# Altium footprint library MOTHER_BOARD_LS1021_v1.01.PcbLib: 69 footprints (part 5 of 5)
Each footprint in its own frame and in the unit in brackets; x right, y up, seen from the top. Pads: shape width x height; smd on the part's side, far side on the other; paste and mask are expansions set on the pad; w line width, h text height; cw(c..) or ccw(c..) is an arc to the next point about the centre after c.
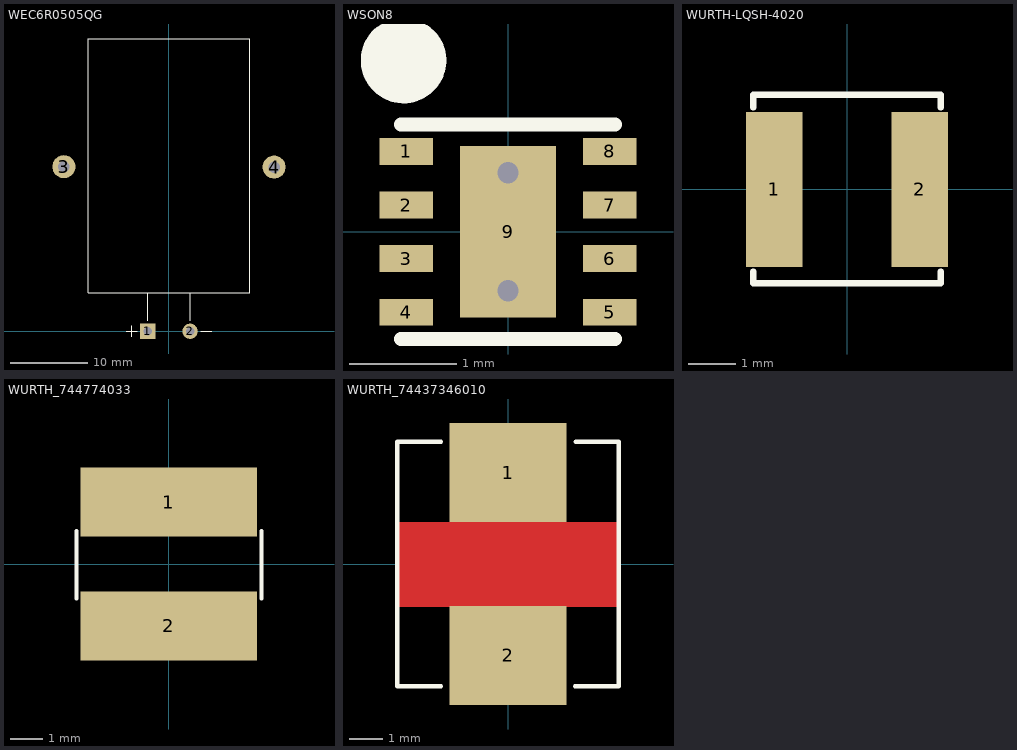
[diagram p4: the footprints below, top view; thin cyan lines are the x and y axes]

## WEC6R0505QG [mm]
pads (4):
  rect 2x2 hole 1.1 paste-0.1 mask+0.05: 1(-2.75,0)
  round 2 hole 1.1 paste-0.1 mask+0.05: 2(2.75,0)
  round 3 hole 1.5 paste-0.1 mask+0.05: 3(-13.65,21.4) 4(13.675,21.35)
Top Overlay:
  lines w0.13: -5.55,0 -4.1,0 ; -4.825,-0.725 -4.825,0.725 ; -2.75,1.4 -2.75,5 ; 2.75,1.4 2.75,5 ; 4.125,0 5.575,0 ; -10.487,5 -10.487,38 10.487,38 10.487,5 -10.487,5
3D body: height 11, standoff 0, extent -10.487,5 10.487,38

## WSON8 [mm]
pads (9):
  rect 0.5x0.25 smd mask+0.05: 1(-0.95,0.75) 2(-0.95,0.25) 3(-0.95,-0.25) 4(-0.95,-0.75) 5(0.95,-0.75) 6(0.95,-0.25) 7(0.95,0.25) 8(0.95,0.75)
  rect 0.9x1.6 smd paste-10 mask+0.05: 9(0,0)
via 0,0.55 diameter 0.45 hole 0.2
via 0,-0.55 diameter 0.45 hole 0.2
Top Overlay:
  circle w0.4: c-0.975,1.6 r0.2
  lines w0.13: -1,-1 1,-1 ; -1,1 1,1
Top Paste:
  rectangle: -0.45,-0.8 0.45,-0.1
  rectangle: -0.45,0.1 0.45,0.8
3D body: height 0.8, standoff 0.05, extent -1,-1 1,1

## WURTH-LQSH-4020 [mm]
pads (2):
  rect 1.2x3.3 smd paste-0.05 mask+0.05: 1(-1.55,0) 2(1.55,0)
Top Overlay:
  lines w0.13: -2,1.75 -2,2.019 2,2.019 2,1.75 ; -2,-1.75 -2,-2 2,-2 2,-1.75 ; -2,-1.75 -2,-1.75 ; 2,-1.75 2,-1.75
3D body "WE-LQSH-4020.stp": height 2, standoff 0.01, extent -2,-2 2,2.019

## WURTH_744774033 [mm]
pads (2):
  rect 5.5x2.15 smd paste-0.1 mask+0.05: 1(0,1.925) 2(0,-1.925)
Top Overlay:
  lines w0.13: -2.875,-1.075 -2.875,1.025 ; 2.9,-1.075 2.9,1.025
3D body "WURTH_744774033.stp": height 4.5, standoff 0, extent -2.889,-2.6 2.899,2.6

## WURTH_74437346010 [mm]
pads (2):
  rect 3.5x2.95 smd paste-0.2 mask+0.05: 1(0,2.725) 2(0,-2.725)
Top Layer:
  pour cut-out: -3.3,1.25 3.3,1.25 3.3,-1.25 3.275,-1.275 -3.3,-1.275
Top Overlay:
  lines w0.13: -2,-3.65 -3.3,-3.65 -3.3,3.65 -2,3.65 ; 2,-3.65 3.3,-3.65 3.3,3.65 2.025,3.65
3D body "WURTH_74437346010.stp": height 2.8, standoff 0, extent -3.3,-3.65 3.3,3.65